# Altium integrated library Connector - JST.IntLib: 6 symbols
Pins are listed as number, name and electrical type; pins without a type are passive.

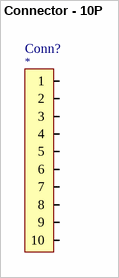
[diagram p0: symbol Connector - 10P]

## Connector - 10P
designator Conn?
Conn, JST, 10P, TH, PAD, Side Entry; Component Category: Connector; ComponentLink1Description: Datasheet; ComponentLink1URL: *; ComponentLink2Description: Supplier Link; ComponentLink2URL: *; Supplier: *; Supplier Part Number: *; Manufacturer: JST; Operating Temperature, Min: -℃; Operating Temperature, Max: +℃; Quantity, Min: *; Quantity, Max: *; Price, Min: *; Supplier Currency: *; Price, Max: *; Supplier Link: *; Component Type: PCB; Package: *; Manufacturer Part Number: *
footprint Connector, S10B-PADSS-1
pins: 1, 2, 3, 4, 5, 6, 7, 8, 9, 10
2 alternate drawings of the same symbol


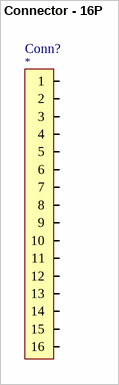
[diagram p1: symbol Connector - 16P]

## Connector - 16P
designator Conn?
Conn, JST, 16P, TH, PAD, Side Entry; Component Category: Connector; ComponentLink1Description: Datasheet; ComponentLink1URL: *; ComponentLink2Description: Supplier Link; ComponentLink2URL: *; Supplier: *; Supplier Part Number: *; Manufacturer: JST; Operating Temperature, Min: -℃; Operating Temperature, Max: +℃; Quantity, Min: *; Quantity, Max: *; Price, Min: *; Supplier Currency: *; Price, Max: *; Supplier Link: *; Component Type: PCB; Package: *; Manufacturer Part Number: *
footprint Connector, S16B-PADSS-1
pins: 1, 2, 3, 4, 5, 6, 7, 8, 9, 10, 11, 12, 13, 14, 15, 16
2 alternate drawings of the same symbol


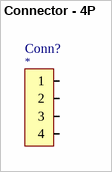
[diagram p2: symbol Connector - 4P]

## Connector - 4P
designator Conn?
Conn, JST, 4P, TH, XA, Side Entry; Component Category: Connector; ComponentLink1Description: Datasheet; ComponentLink1URL: *; ComponentLink2Description: Supplier Link; ComponentLink2URL: *; Supplier: *; Supplier Part Number: *; Manufacturer: JST; Operating Temperature, Min: -℃; Operating Temperature, Max: +℃; Quantity, Min: *; Quantity, Max: *; Price, Min: *; Supplier Currency: *; Price, Max: *; Supplier Link: *; Component Type: PCB; Package: *; Manufacturer Part Number: *
footprint Connector, S04B-XASK-1
pins: 1, 2, 3, 4


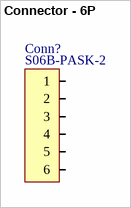
[diagram p3: symbol Connector - 6P]

## Connector - 6P
designator Conn?  Manufacturer Part Number: S06B-PASK-2  (hidden comment: *)
Connector, 6Pin; Manufacturer: JST; ComponentLink1Description: Datasheet; ComponentLink1URL: C:\Users\Public\Documents\Altium\env\Datasheets\Connector\S06B-PASK-2(LF)(SN).pdf; ComponentLink2Description: Supplier Link; ComponentLink2URL: https://www.digikey.com/en/products/detail/jst-sales-america-inc/S06B-PASK-2/926757?s=N4IgTCBcDaIMoAYBsAhAtABQIJwNJrAAoAZAMQEpC4A5ckAXQF8g; Supplier Part Number: 455-S06B-PASK-2-ND; Supplier Link: https://www.digikey.com/en/products/detail/jst-sales-america-inc/S06B-PASK-2/926757?s=N4IgTCBcDaIMoAYBsAhAtABQIJwNJrAAoAZAMQEpC4A5ckAXQF8g; Supplier Currency: $; Supplier: Digikey; Quantity, Min: 1; Quantity, Max: 10,000; Price, Min: $0.38000; Price, Max: $0.20057; Operating Temperature, Min: -25℃; Operating Temperature, Max: +85℃; Component Type: PCB; Component Category: Connector; Package: TH, Side
footprint Connector, S06B-PASK-2 (Richtek, RT2862xSP, SOP, 8Pin)
pins: 1, 2, 3, 4, 5, 6


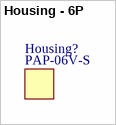
[diagram p4: symbol Housing - 6P]

## Housing - 6P
designator Housing?  Manufacturer Part Number: PAP-06V-S  (hidden comment: *)
Housing, 6Pin; Manufacturer: JST; Component Category: Connector; ComponentLink1Description: Datasheet; ComponentLink1URL: C:\Users\Public\Documents\Altium\env\Datasheets\Connector\PAP-06V-S.pdf; ComponentLink2Description: Supplier Link; ComponentLink2URL: https://www.digikey.com/en/products/detail/jst-sales-america-inc/pap-06v-s/759978; Supplier Part Number: 455-1490-ND; Supplier Link: https://www.digikey.com/en/products/detail/jst-sales-america-inc/pap-06v-s/759978; Supplier Currency: $; Supplier: Digikey; Quantity, Min: 1; Quantity, Max: 3,000; Price, Min: $0.13000; Price, Max: $0.07648; Operating Temperature, Min: -25℃; Operating Temperature, Max: +85℃; Component Type: PCB; Package: Housing
footprint Housing, PAP-06V-S
footprint Housing, PADP-10V-1-S
footprint Housing, PADP-16V-1-S
footprint Housing, XAP-04V-1


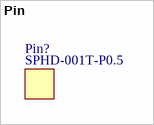
[diagram p5: symbol Pin]

## Pin
designator Pin?  Manufacturer Part Number: SPHD-001T-P0.5  (hidden comment: *)
Pin; Manufacturer: JST; Component Category: Connector; ComponentLink1Description: Datasheet; ComponentLink1URL: C:\Users\Public\Documents\Altium\env\Datasheets\Connector\SPHD-001T-P0.5.pdf; ComponentLink2Description: Supplier Link; ComponentLink2URL: https://www.digikey.com/en/products/detail/jst-sales-america-inc/sphd-001t-p0-5/26212452; Supplier Part Number: 455-1325-1000-ND; Supplier Link: https://www.digikey.com/en/products/detail/jst-sales-america-inc/sphd-001t-p0-5/26212452; Supplier Currency: $; Supplier: Digikey; Quantity, Min: 1,000; Quantity, Max: *; Price, Min: $0.02410; Price, Max: $*; Operating Temperature, Min: *℃; Operating Temperature, Max: *℃; Component Type: PCB; Package: Pin
footprint Pin, SPHD-001T-P0.5
footprint Pin, SPND-001T-C0.5
footprint Pin, SXA-001T-P0.6